# Altium footprint library Semi-ATE.PcbLib: 155 footprints (part 6 of 10)
Each footprint in its own frame and in the unit in brackets; x right, y up, seen from the top. Pads: shape width x height; smd on the part's side, far side on the other; paste and mask are expansions set on the pad; w line width, h text height; cw(c..) or ccw(c..) is an arc to the next point about the centre after c.
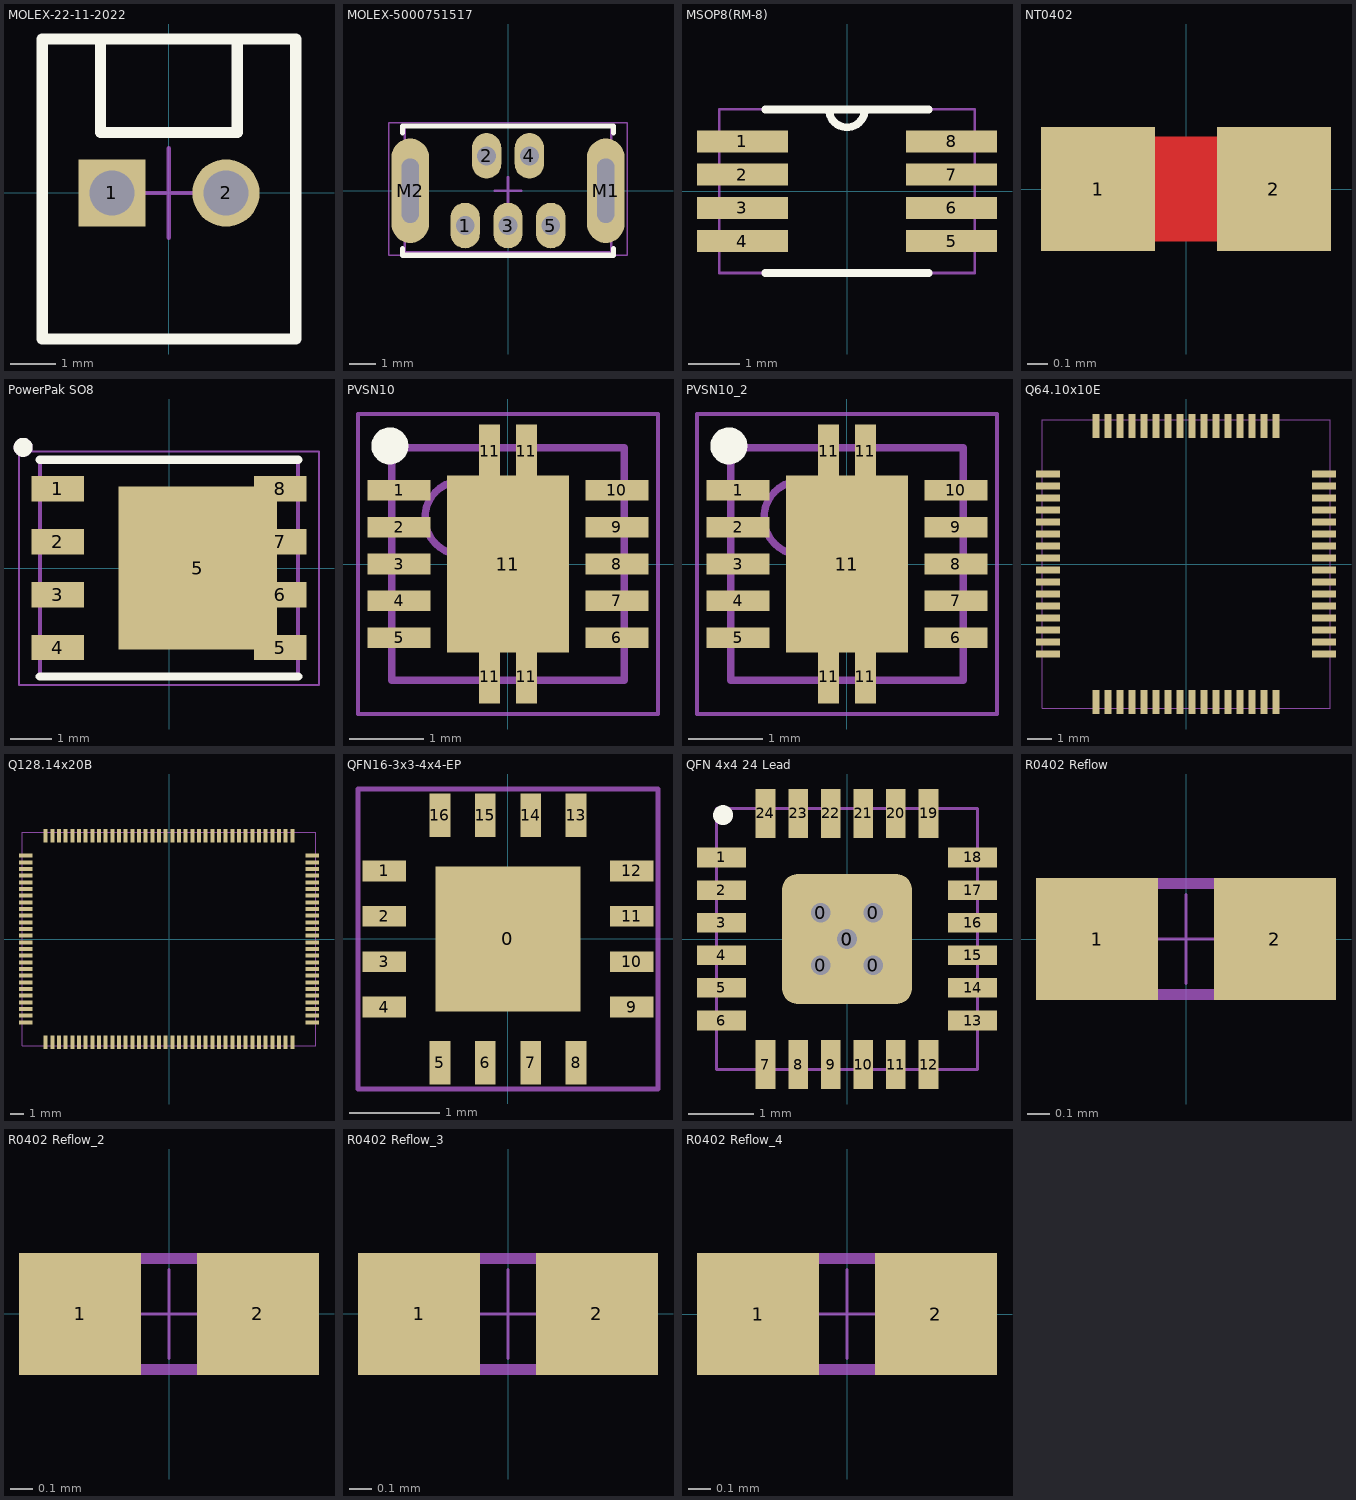
[diagram p5: the footprints below, top view; thin cyan lines are the x and y axes]

## MiniSCT LB StandOff [mm]
Top Designator:
  text ".Designator" at -7.617,-0.508 h1.52
3D body "MiniSCT_LB_StandOff.STEP": height 26.9, standoff 0, extent -3.5,-3.5 3.5,3.5

## MOLEX-22-11-2022 [mm]
height 1.6
pads (2):
  rect 1.5x1.5 hole 1: 1(-1.27,0)
  round 1.5 hole 1: 2(1.27,0)
Top Overlay:
  lines w0.254: -1.524,3.429 -1.524,1.347 0,1.347 1.524,1.347 1.524,3.429 ; -2.819,-3.251 -2.819,3.429 2.82,3.429 2.82,-3.251 -2.819,-3.251
Top Designator:
  text ".Designator" at -7.617,-0.419 h1.52
Top 3D Body:
  lines w0.05: -2.819,-3.251 -2.819,3.429 2.82,3.429 2.82,-3.251 -2.819,-3.251
Bottom Gold Plating:
  lines w0.1: -1,0 1,0 ; 0,-1 0,1
3D body "0022112022.STEP": height 15.88, standoff -3.56, extent -2.819,-3.251 2.82,3.429

## MOLEX-5000751517 [mm]
pads (7):
  oval 1.1x1.7 hole 0.7: 1(-1.6,-1.3) 2(-0.8,1.3) 3(0,-1.3) 4(0.8,1.3) 5(1.6,-1.3)
  oval 1.4x3.9 hole 0.65 slot 2.4 at 90 deg: M1(3.65,0) M2(-3.65,0)
Top Overlay:
  lines w0.2: -3.937,-2.159 -3.937,-2.413 3.937,-2.413 3.937,-2.159 ; -3.937,2.159 -3.937,2.413 3.937,2.413 3.937,2.159
Top Designator:
  text ".Designator" at -7.618,-0.482 h1.52
Top 3D Body:
  lines w0.05: -4.445,-2.413 -4.445,2.54 4.445,2.54 4.445,-2.413 -4.445,-2.413
Bottom 3D Body:
  lines w0.1: -3.85,-2.3 3.85,-2.3 3.85,2.4 -3.85,2.4 -3.85,-2.3
Bottom Gold Plating:
  lines w0.1: -0.5,0 0.5,0 ; 0,-0.5 0,0.5
3D body: height 7.72, standoff -2.08, extent -3.85,-2.3 3.85,2.4

## MSOP8(RM-8) [mil] "8-Lead MSOP"
pads (8):
  rect 70x17 smd: 1(-80.5,38.39) 2(-80.5,12.8) 3(-80.5,-12.8) 4(-80.5,-38.39) 5(80.5,-38.39) 6(80.5,-12.8) 7(80.5,12.8) 8(80.5,38.39)
Top Overlay:
  lines w5.98: -13.57,60.6 ccw(c0,62.99) 13.78,62.99
  lines w6: -63,-63 63,-63 ; -63,63 63,63
Top Designator:
  text ".Designator" at -299.9,-19.99 h60
Top 3D Body:
  lines w1.97: -98.43,-62.99 -98.43,62.99 98.43,62.99 98.43,-62.99 -98.43,-62.99
3D body "MSOP8(RM-8).step": height 43.31, standoff 0, extent -97.19,-61.02 97.2,61.03

## NT0402 [mm] "20 mil"
pads (2):
  rect 0.55x0.6 smd paste-1: 1(-0.425,0) 2(0.425,0)
Top Layer:
  lines w0.508: -0.425,0 0.425,0
Top Designator:
  text ".Designator" at -7.618,-0.508 h1.52
Bottom Gold Plating:
  lines w0.013: -0.2,0 0.2,0 ; 0,-0.2 0,0.2

## PowerPak SO8 [mm]
pads (9):
  rect 1.27x0.61 smd: 1(-2.67,1.905) 2(-2.67,0.635) 3(-2.67,-0.635) 4(-2.67,-1.905) 5(2.67,-1.905) 6(2.67,-0.635) 7(2.67,0.635) 8(2.67,1.905)
  rect 3.81x3.91 smd: 5(0.69,0)
Top Overlay:
  circle w0.254: c-3.5,2.9 r0.1
  lines w0.2: -3.1,-2.6 3.1,-2.6 ; -3.1,2.6 3.1,2.6
Top Designator:
  text ".Designator" at -7.669,-0.357 h1.52
Top 3D Body:
  lines w0.05: -3.6,-2.8 3.6,-2.8 3.6,2.8 -3.6,2.8 -3.6,-2.8
Bottom 3D Body:
  circle w0.254: c-3.5,2.9 r0.1
  lines w0.1: -3.1,-2.6 -3.1,2.6 3.1,2.6 3.1,-2.6 -3.1,-2.6
Bottom Gold Plating:
  lines w0.1: -1,0 1,0 ; 0,-1 0,1
3D body: height 1.12, standoff 0, extent -3.1,-2.6 3.1,2.6

## PVSN10 [mm]
height 1
pads (15):
  rect 0.85x0.28 smd: 1(-1.475,1) 2(-1.475,0.5) 3(-1.475,0) 4(-1.475,-0.5) 5(-1.475,-1) 6(1.475,-1) 7(1.475,-0.5) 8(1.475,0) 9(1.475,0.5) 10(1.475,1)
  rect 0.28x0.72 smd: 11(-0.25,-1.53) 11(-0.25,1.53) 11(0.25,-1.53) 11(0.25,1.53)
  rect 1.65x2.4 smd: 11(0,0)
Top Overlay:
  circle w0.25: c-1.6,1.6 r0.125
Top Designator:
  text ".Designator" at -7.618,-0.508 h1.52
Top 3D Body:
  lines w0.05: -2.032,-2.032 -2.032,2.032 2.032,2.032 2.032,-2.032 -2.032,-2.032
Bottom 3D Body:
  circle w0.1: c-0.625,0.625 r0.5
  lines w0.1: -1.575,-1.575 1.575,-1.575 1.575,1.575 -1.575,1.575 -1.575,-1.575
Bottom Gold Plating:
  lines w0.1: -0.5,0 0.5,0 ; 0,-0.5 0,0.5
3D body: height 1, standoff 0, extent -1.575,-1.575 1.575,1.575

## PVSN10_2 [mm]
pads (15):
  rect 0.85x0.28 smd: 1(-1.475,1) 2(-1.475,0.5) 3(-1.475,0) 4(-1.475,-0.5) 5(-1.475,-1) 6(1.475,-1) 7(1.475,-0.5) 8(1.475,0) 9(1.475,0.5) 10(1.475,1)
  rect 0.28x0.72 smd: 11(-0.25,-1.53) 11(-0.25,1.53) 11(0.25,-1.53) 11(0.25,1.53)
  rect 1.65x2.4 smd: 11(0,0)
Top Overlay:
  circle w0.25: c-1.6,1.6 r0.125
Top Designator:
  text ".Designator" at -7.618,-0.508 h1.52
Top 3D Body:
  lines w0.05: -2.032,-2.032 2.032,-2.032 2.032,2.032 -2.032,2.032 -2.032,-2.032
Bottom 3D Body:
  circle w0.1: c-0.625,0.625 r0.5
  lines w0.1: -1.575,-1.575 -1.575,1.575 1.575,1.575 1.575,-1.575 -1.575,-1.575
Bottom Gold Plating:
  lines w0.1: -0.5,0 0.5,0 ; 0,-0.5 0,0.5
3D body: height 1, standoff 0, extent -1.575,-1.575 1.575,1.575

## Q64.10x10E [mm]
pads (64):
  rect 0.3x1 smd mask+0.1: 1(-3.75,-5.75) 2(-3.25,-5.75) 3(-2.75,-5.75) 4(-2.25,-5.75) 5(-1.75,-5.75) 6(-1.25,-5.75) 7(-0.75,-5.75) 8(-0.25,-5.75) 9(0.25,-5.75) 10(0.75,-5.75) 11(1.25,-5.75) 12(1.75,-5.75) 13(2.25,-5.75) 14(2.75,-5.75) 15(3.25,-5.75) 16(3.75,-5.75) 33(3.75,5.75) 34(3.25,5.75) 35(2.75,5.75) 36(2.25,5.75) 37(1.75,5.75) 38(1.25,5.75) 39(0.75,5.75) 40(0.25,5.75) 41(-0.25,5.75) 42(-0.75,5.75) 43(-1.25,5.75) 44(-1.75,5.75) 45(-2.25,5.75) 46(-2.75,5.75) 47(-3.25,5.75) 48(-3.75,5.75)
  rect 1x0.3 smd mask+0.1: 17(5.75,-3.75) 18(5.75,-3.25) 19(5.75,-2.75) 20(5.75,-2.25) 21(5.75,-1.75) 22(5.75,-1.25) 23(5.75,-0.75) 24(5.75,-0.25) 25(5.75,0.25) 26(5.75,0.75) 27(5.75,1.25) 28(5.75,1.75) 29(5.75,2.25) 30(5.75,2.75) 31(5.75,3.25) 32(5.75,3.75) 49(-5.75,3.75) 50(-5.75,3.25) 51(-5.75,2.75) 52(-5.75,2.25) 53(-5.75,1.75) 54(-5.75,1.25) 55(-5.75,0.75) 56(-5.75,0.25) 57(-5.75,-0.25) 58(-5.75,-0.75) 59(-5.75,-1.25) 60(-5.75,-1.75) 61(-5.75,-2.25) 62(-5.75,-2.75) 63(-5.75,-3.25) 64(-5.75,-3.75)
Top Overlay:
  text "." at -5.6,-5.3 h1
Top Designator:
  text ".Designator" at -7.618,-0.508 h1.52
Top 3D Body:
  lines w0.05: -6,-6 6,-6 6,6 -6,6 -6,-6
3D body "Q64.10x10E.STEP": height 1.2, standoff 0, extent -6,-6 6,6

## Q128.14x20B [mm]
pads (128):
  rect 0.3x1 smd mask+0.1: 1(-9.25,-7.75) 2(-8.75,-7.75) 3(-8.25,-7.75) 4(-7.75,-7.75) 5(-7.25,-7.75) 6(-6.75,-7.75) 7(-6.25,-7.75) 8(-5.75,-7.75) 9(-5.25,-7.75) 10(-4.75,-7.75) 11(-4.25,-7.75) 12(-3.75,-7.75) 13(-3.25,-7.75) 14(-2.75,-7.75) 15(-2.25,-7.75) 16(-1.75,-7.75) 17(-1.25,-7.75) 18(-0.75,-7.75) 19(-0.25,-7.75) 20(0.25,-7.75) 21(0.75,-7.75) 22(1.25,-7.75) 23(1.75,-7.75) 24(2.25,-7.75) 25(2.75,-7.75) 26(3.25,-7.75) 27(3.75,-7.75) 28(4.25,-7.75) 29(4.75,-7.75) 30(5.25,-7.75) 31(5.75,-7.75) 32(6.25,-7.75) 33(6.75,-7.75) 34(7.25,-7.75) 35(7.75,-7.75) 36(8.25,-7.75) 37(8.75,-7.75) 38(9.25,-7.75) 65(9.25,7.75) 66(8.75,7.75) 67(8.25,7.75) 68(7.75,7.75) 69(7.25,7.75) 70(6.75,7.75) 71(6.25,7.75) 72(5.75,7.75) 73(5.25,7.75) 74(4.75,7.75) 75(4.25,7.75) 76(3.75,7.75) 77(3.25,7.75) 78(2.75,7.75) 79(2.25,7.75) 80(1.75,7.75) 81(1.25,7.75) 82(0.75,7.75) 83(0.25,7.75) 84(-0.25,7.75) 85(-0.75,7.75) 86(-1.25,7.75) 87(-1.75,7.75) 88(-2.25,7.75) 89(-2.75,7.75) 90(-3.25,7.75) 91(-3.75,7.75) 92(-4.25,7.75) 93(-4.75,7.75) 94(-5.25,7.75) 95(-5.75,7.75) 96(-6.25,7.75) 97(-6.75,7.75) 98(-7.25,7.75) 99(-7.75,7.75) 100(-8.25,7.75) 101(-8.75,7.75) 102(-9.25,7.75)
  rect 1x0.3 smd mask+0.1: 39(10.75,-6.25) 40(10.75,-5.75) 41(10.75,-5.25) 42(10.75,-4.75) 43(10.75,-4.25) 44(10.75,-3.75) 45(10.75,-3.25) 46(10.75,-2.75) 47(10.75,-2.25) 48(10.75,-1.75) 49(10.75,-1.25) 50(10.75,-0.75) 51(10.75,-0.25) 52(10.75,0.25) 53(10.75,0.75) 54(10.75,1.25) 55(10.75,1.75) 56(10.75,2.25) 57(10.75,2.75) 58(10.75,3.25) 59(10.75,3.75) 60(10.75,4.25) 61(10.75,4.75) 62(10.75,5.25) 63(10.75,5.75) 64(10.75,6.25) 103(-10.75,6.25) 104(-10.75,5.75) 105(-10.75,5.25) 106(-10.75,4.75) 107(-10.75,4.25) 108(-10.75,3.75) 109(-10.75,3.25) 110(-10.75,2.75) 111(-10.75,2.25) 112(-10.75,1.75) 113(-10.75,1.25) 114(-10.75,0.75) 115(-10.75,0.25) 116(-10.75,-0.25) 117(-10.75,-0.75) 118(-10.75,-1.25) 119(-10.75,-1.75) 120(-10.75,-2.25) 121(-10.75,-2.75) 122(-10.75,-3.25) 123(-10.75,-3.75) 124(-10.75,-4.25) 125(-10.75,-4.75) 126(-10.75,-5.25) 127(-10.75,-5.75) 128(-10.75,-6.25)
Top Overlay:
  text "." at -10.5,-7.3 h1
Top Designator:
  text ".Designator" at -7.618,-0.508 h1.52
Top 3D Body:
  lines w0.05: -11,-8 -11,8 11,8 11,-8 -11,-8
3D body "Q128.14x20B.STEP": height 1.64, standoff 0, extent -11,-8 11,8

## QFN16-3x3-4x4-EP [mm] "3x3mm, 4x4=16 leads QFN with Exposed Pad"
pads (17):
  rect 1.6x1.6 smd: 0(0,0)
  rect 0.48x0.23 smd: 1(-1.36,0.75) 2(-1.36,0.25) 3(-1.36,-0.25) 4(-1.36,-0.75) 9(1.36,-0.75) 10(1.36,-0.25) 11(1.36,0.25) 12(1.36,0.75)
  rect 0.23x0.48 smd: 5(-0.75,-1.36) 6(-0.25,-1.36) 7(0.25,-1.36) 8(0.75,-1.36) 13(0.75,1.36) 14(0.25,1.36) 15(-0.25,1.36) 16(-0.75,1.36)
Top Overlay:
  text "." at -1.5,1.36 h1
Top Designator:
  text ".Designator" at -7.644,-0.468 h1.52
Top 3D Body:
  lines w0.05: -1.651,-1.651 -1.651,1.651 1.651,1.651 1.651,-1.651 -1.651,-1.651
3D body "3x3-4x4-QFN16EP.STEP": height 0.85, standoff 0, extent -1.51,-1.51 1.51,1.51

## QFN 4x4 24 Lead [mm] "LFCSP_WQ, 24 Leads, 4x4 mm outline"
pads (30):
  round 0.4 hole 0.3: 0(-0.4,-0.4) 0(-0.4,0.4) 0(0,0) 0(0.4,-0.4) 0(0.4,0.4)
  rrect25% 2x2 smd: 0(0,0)
  rect 0.75x0.3 smd: 1(-1.925,1.25) 2(-1.925,0.75) 3(-1.925,0.25) 4(-1.925,-0.25) 5(-1.925,-0.75) 6(-1.925,-1.25) 13(1.925,-1.25) 14(1.925,-0.75) 15(1.925,-0.25) 16(1.925,0.25) 17(1.925,0.75) 18(1.925,1.25)
  rect 0.3x0.75 smd: 7(-1.25,-1.925) 8(-0.75,-1.925) 9(-0.25,-1.925) 10(0.25,-1.925) 11(0.75,-1.925) 12(1.25,-1.925) 19(1.25,1.925) 20(0.75,1.925) 21(0.25,1.925) 22(-0.25,1.925) 23(-0.75,1.925) 24(-1.25,1.925)
Top Overlay:
  circle w0.254: c-1.9,1.9 r0.025
Top Designator:
  text ".Designator" at -7.618,-0.508 h1.52
Top 3D Body:
  lines w0.05: -2,-2 2,-2 2,2 -2,2 -2,-2
3D body "LFCSP24.step": height 0.83, standoff -0.02, extent -2,-2 2,2

## R0402 Reflow [mm] "SMT Resistor 0402 Reflow Soldering"
height 10
pads (2):
  rect 0.55x0.55 smd: 1(-0.4,0) 2(0.4,0)
Top Solder:
  rectangle: -0.3,-0.377 0.3,0.377
Top Designator:
  text ".Designator" at -7.618,-0.508 h1.52
Top 3D Body:
  lines w0.05: -0.5,-0.25 0.5,-0.25 0.5,0.25 -0.5,0.25 -0.5,-0.25
Bottom Gold Plating:
  lines w0.013: -0.2,0 0.2,0 ; 0,-0.2 0,0.2
3D body "R0402.STEP": height 0.35, standoff 0, extent -0.5,-0.25 0.5,0.25

## R0402 Reflow_2 [mm]
pads (2):
  rect 0.55x0.55 smd: 1(-0.4,0) 2(0.4,0)
Top Solder:
  rectangle: -0.3,-0.377 0.3,0.377
Top Designator:
  text ".Designator" at -7.618,-0.508 h1.52
Top 3D Body:
  lines w0.05: -0.5,-0.25 -0.5,0.25 0.5,0.25 0.5,-0.25 -0.5,-0.25
Bottom Gold Plating:
  lines w0.013: -0.2,0 0.2,0 ; 0,-0.2 0,0.2
3D body "R0402.STEP": height 0.35, standoff 0, extent -0.5,-0.25 0.5,0.25

## R0402 Reflow_3 [mm]
pads (2):
  rect 0.55x0.55 smd: 1(-0.4,0) 2(0.4,0)
Top Solder:
  rectangle: -0.3,-0.377 0.3,0.377
Top Designator:
  text ".Designator" at -7.618,-0.508 h1.52
Top 3D Body:
  lines w0.05: -0.5,-0.25 -0.5,0.25 0.5,0.25 0.5,-0.25 -0.5,-0.25
Bottom Gold Plating:
  lines w0.013: -0.2,0 0.2,0 ; 0,-0.2 0,0.2
3D body "R0402.STEP": height 0.35, standoff 0, extent -0.5,-0.25 0.5,0.25

## R0402 Reflow_4 [mm]
pads (2):
  rect 0.55x0.55 smd: 1(-0.4,0) 2(0.4,0)
Top Solder:
  rectangle: -0.3,-0.377 0.3,0.377
Top Designator:
  text ".Designator" at -7.618,-0.508 h1.52
Top 3D Body:
  lines w0.05: -0.5,-0.25 -0.5,0.25 0.5,0.25 0.5,-0.25 -0.5,-0.25
Bottom Gold Plating:
  lines w0.013: -0.2,0 0.2,0 ; 0,-0.2 0,0.2
3D body "R0402.STEP": height 0.35, standoff 0, extent -0.5,-0.25 0.5,0.25